# Altium footprint library d1_PcbLib.PcbLib: 266 footprints (part 11 of 17)
Each footprint in its own frame and in the unit in brackets; x right, y up, seen from the top. Pads: shape width x height; smd on the part's side, far side on the other; paste and mask are expansions set on the pad; w line width, h text height; cw(c..) or ccw(c..) is an arc to the next point about the centre after c.
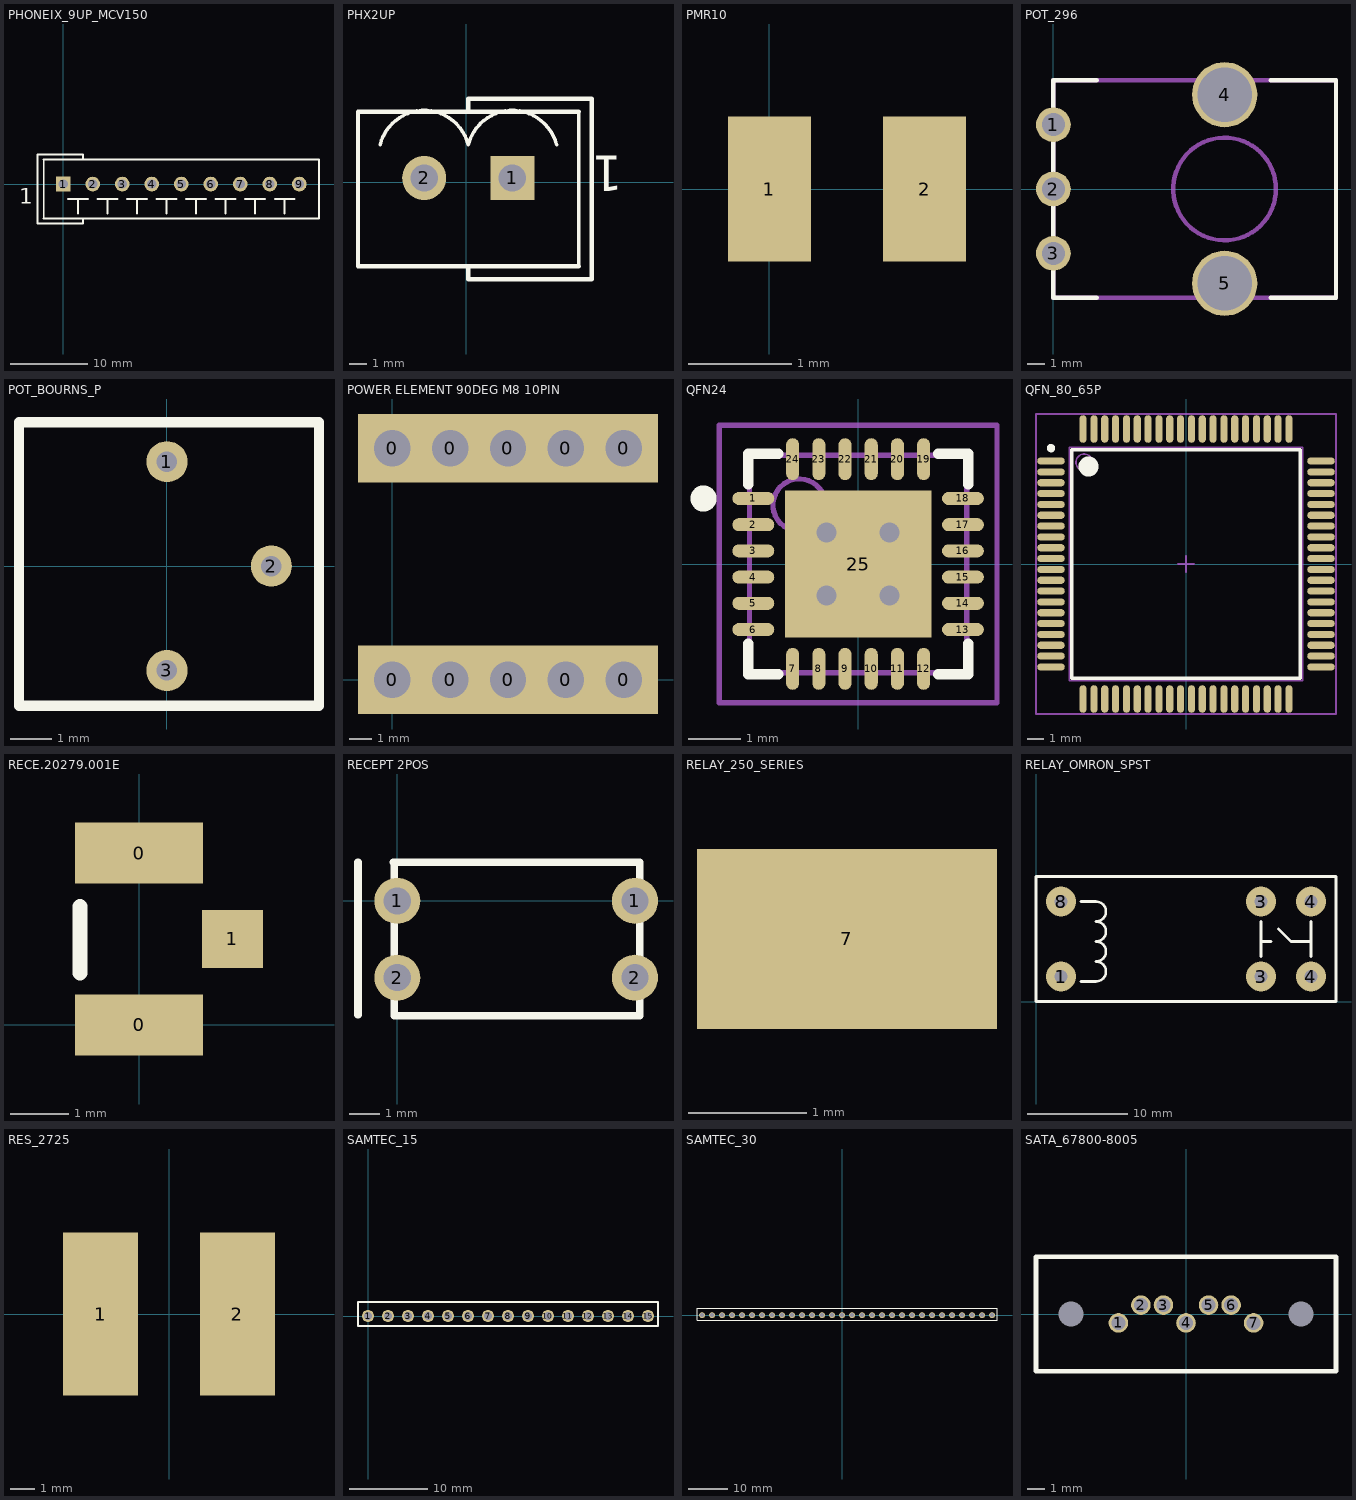
[diagram p10: the footprints below, top view; thin cyan lines are the x and y axes]

## PHONEIX_9UP_MCV150 [mil] "9 pin Phoneix conector"
height 100
pads (9):
  rect 75x75 hole 47: 1(0,0)
  round 75 hole 47: 2(150,0) 3(300,0) 4(450,0) 5(600,0) 6(750,0) 7(900,0) 8(1050,0) 9(1200,0)
Top Overlay:
  lines w8: -100,-175 -100,125 ; 1300,-175 1300,125
  lines w10: -100,-175 1300,-175 ; -100,125 1300,125 ; 25,-75 125,-75 ; 75,-150 75,-75 ; 100,-175 100,-200 -130,-200 -130,150 100,150 100,130 ; 175,-75 275,-75 ; 225,-150 225,-75 ; 325,-75 425,-75 ; 375,-150 375,-75 ; 475,-75 575,-75 ; 525,-150 525,-75 ; 625,-75 725,-75 ; 675,-150 675,-75 ; 775,-75 875,-75 ; 825,-150 825,-75 ; 925,-75 1025,-75 ; 975,-150 975,-75 ; 1075,-75 1175,-75 ; 1125,-150 1125,-75
  text "1" at -225,-100 h80

## PHX2UP [mil]
pads (2):
  rect 100x100 hole 62: 1(105,10)
  round 100 hole 62: 2(-95,10)
Top Overlay:
  lines w8: -245,-190 -245,160 ; -195.02,84.94 cw(c-95,60) 5.02,84.94 cw(c105,60) 205.02,84.94 ; 255,-190 255,160
  lines w10: -245,-190 255,-190 ; -245,160 255,160 ; 5,-190 5,-220 285,-220 285,190 275,190 5,190 5,160
  text "1" at 355,60 h80
3D body: height 472.44, standoff -153.54, extent -234.37,-178.58 244.37,160

## PMR10 [mm]
pads (2):
  rect 0.8x1.4 smd: 1(0,0) 2(1.5,0)

## POT_296 [mil]
pads (5):
  round 80 hole 53: 1(0,148) 2(0,0) 3(0,-148)
  round 150 hole 125: 4(394,217) 5(394,-217)
Top Overlay:
  lines w10: 100,-250 0,-250 0,250 100,250 ; 500,-250 650,-250 650,250 500,250
Mechanical 13:
  circle w10: c393.7,0 r118.11
  lines w10: 0,-250 650,-250 650,0 650,250 0,250 0,-250
3D body: height 342, standoff 0, extent 0.02,-249.98 649.98,249.98
3D body: height 800, standoff 0, extent 275.25,-118.46 512.16,118.46

## POT_BOURNS_P [mm]
height 4.7
pads (3):
  round 1 hole 0.5: 1(0,2.54) 2(2.54,0) 3(0,-2.54)
Top Overlay:
  lines w0.254: -3.6,-3.4 -3.6,3.5 3.7,3.5 3.7,-3.4 -3.6,-3.4
3D body: height 4.4, standoff -3, extent -3.325,-3.277 3.275,3.323

## POWER ELEMENT 90DEG M8 10PIN [mm]
pads (10):
  rect 3x3 hole 1.6: 0(0,0) 0(0,10.16) 0(2.54,0) 0(2.54,10.16) 0(5.08,10.16) 0(5.08,0) 0(7.62,0) 0(7.62,10.16) 0(10.16,10.16) 0(10.16,0)
3D body: height 20.57, standoff -3.5, extent -6.706,-5.566 13.294,62.125

## QFN24 [mm] "QFN, 24-Leads, Body 4.2x4.2mm (max), Pitch 0.50mm, IPC Medium Density"
height 0.8
pads (25):
  oval 0.8x0.25 smd: 1(-2,1.25) 2(-2,0.75) 3(-2,0.25) 4(-2,-0.25) 5(-2,-0.75) 6(-2,-1.25) 13(2,-1.25) 14(2,-0.75) 15(2,-0.25) 16(2,0.25) 17(2,0.75) 18(2,1.25)
  oval 0.25x0.8 smd: 7(-1.25,-2) 8(-0.75,-2) 9(-0.25,-2) 10(0.25,-2) 11(0.75,-2) 12(1.25,-2) 19(1.25,2) 20(0.75,2) 21(0.25,2) 22(-0.25,2) 23(-0.75,2) 24(-1.25,2)
  rect 2.8x2.8 smd: 25(0,0)
via -0.6,0.6 diameter 0.762 hole 0.381
via 0.6,0.6 diameter 0.762 hole 0.381
via -0.6,-0.6 diameter 0.762 hole 0.381
via 0.6,-0.6 diameter 0.762 hole 0.381
Top Overlay:
  circle w0.25: c-2.95,1.25 r0.125
  lines w0.2: -2.1,-1.525 -2.1,-2.1 -1.525,-2.1 ; -2.1,1.525 -2.1,2.1 -1.525,2.1 ; 1.525,-2.1 2.1,-2.1 2.1,-1.525 ; 1.525,2.1 2.1,2.1 2.1,1.525
Mechanical 13:
  circle w0.1: c-1.125,1.125 r0.5
  lines w0.1: -2.075,-2.075 -2.075,2.075 2.075,2.075 2.075,-2.075 -2.075,-2.075
Mechanical 15:
  lines w0.1: -0.5,0 0.5,0 ; 0,-0.5 0,0.5 ; -2.65,-2.65 -2.65,2.65 2.65,2.65 2.65,-2.65 -2.65,-2.65
3D body: height 0.8, standoff 0.01, extent -2.075,-2.075 2.075,2.075

## QFN_80_65P [mm]
pads (80):
  oval 1.651x0.432 smd: 1(-8.1,6.175) 2(-8.1,5.525) 3(-8.1,4.875) 4(-8.1,4.225) 5(-8.1,3.575) 6(-8.1,2.925) 7(-8.1,2.275) 8(-8.1,1.625) 9(-8.1,0.975) 10(-8.1,0.325) 11(-8.1,-0.325) 12(-8.1,-0.975) 13(-8.1,-1.625) 14(-8.1,-2.275) 15(-8.1,-2.925) 16(-8.1,-3.575) 17(-8.1,-4.225) 18(-8.1,-4.875) 19(-8.1,-5.525) 20(-8.1,-6.175) 41(8.1,-6.175) 42(8.1,-5.525) 43(8.1,-4.875) 44(8.1,-4.225) 45(8.1,-3.575) 46(8.1,-2.925) 47(8.1,-2.275) 48(8.1,-1.625) 49(8.1,-0.975) 50(8.1,-0.325) 51(8.1,0.325) 52(8.1,0.975) 53(8.1,1.625) 54(8.1,2.275) 55(8.1,2.925) 56(8.1,3.575) 57(8.1,4.225) 58(8.1,4.875) 59(8.1,5.525) 60(8.1,6.175)
  oval 0.432x1.651 smd: 21(-6.175,-8.1) 22(-5.525,-8.1) 23(-4.875,-8.1) 24(-4.225,-8.1) 25(-3.575,-8.1) 26(-2.925,-8.1) 27(-2.275,-8.1) 28(-1.625,-8.1) 29(-0.975,-8.1) 30(-0.325,-8.1) 31(0.325,-8.1) 32(0.975,-8.1) 33(1.625,-8.1) 34(2.275,-8.1) 35(2.925,-8.1) 36(3.575,-8.1) 37(4.225,-8.1) 38(4.875,-8.1) 39(5.525,-8.1) 40(6.175,-8.1) 61(6.175,8.1) 62(5.525,8.1) 63(4.875,8.1) 64(4.225,8.1) 65(3.575,8.1) 66(2.925,8.1) 67(2.275,8.1) 68(1.625,8.1) 69(0.975,8.1) 70(0.325,8.1) 71(-0.325,8.1) 72(-0.975,8.1) 73(-1.625,8.1) 74(-2.275,8.1) 75(-2.925,8.1) 76(-3.575,8.1) 77(-4.225,8.1) 78(-4.875,8.1) 79(-5.525,8.1) 80(-6.175,8.1)
Top Overlay:
  circle w0.6: c-5.85,5.85 r0.3
  circle w0.25: c-8.1,6.95 r0.125
  lines w0.2: -6.85,-6.85 6.85,-6.85 6.85,6.85 -6.85,6.85 -6.85,-6.85
Mechanical 13:
  circle w0.1: c-6.1,6.1 r0.5
  lines w0.1: -7,-7 7,-7 7,7 -7,7 -7,-7
Mechanical 15:
  lines w0.1: -0.5,0 0.5,0 ; 0,-0.5 0,0.5 ; -9,-9 9,-9 9,9 -9,9 -9,-9
3D body: height 2.45, standoff 0, extent -7,-7 7,7

## RECE.20279.001E [mm] "U.FL Connector Footprint"
height 1.25
pads (3):
  rect 2.2x1.05 smd: 0(0,0) 0(0,2.95)
  rect 1.05x1 smd: 1(1.6,1.475)
Top Overlay:
  lines w0.254: -1.016,0.889 -1.016,2.032

## RECEPT 2POS [mil]
pads (4):
  round 60 hole 35.43: 1(0,0) 1(309.84,0) 2(0,-100) 2(309.84,-100)
Top Overlay:
  lines w10: -51.18,-148.62 -51.18,50.2 ; -4.92,50.2 315.94,50.2 315.94,-149.61 -3.94,-149.61 -3.94,50.2
3D body: height 132.14, standoff -120.51, extent -3.5,-149.8 316.5,50.2

## RELAY_250_SERIES [mil] "FOR HG2-DC12V"
pads (1):
  rect 100x60 smd: 7(-136,212)
via 2,4 diameter 50 hole 28
via 174,4 diameter 50 hole 28
via 175,83 diameter 50 hole 28
via 3,87 diameter 50 hole 28
via 2,190 diameter 50 hole 28
via 176,193 diameter 50 hole 28
via 171,369 diameter 50 hole 28
via -11,371 diameter 50 hole 28

## RELAY_OMRON_SPST [mm]
height 15.7
pads (6):
  round 3 hole 1.3: 1(2.5,2.5) 3(22.5,2.5) 3(22.5,10) 4(27.5,2.5) 4(27.5,10) 8(2.5,10)
Top Overlay:
  lines w0.254: 4.5,2 6,2 ccw(c6,3) 6,4 ccw(c6,5) 6,6 ccw(c6,7) 6,8 ccw(c6,9) 6,10 4.5,10 ; 22.5,4.5 22.5,8 ; 22.5,6 23.5,6 ; 24.25,7.25 25.5,6 27.5,6 ; 27.5,4.5 27.5,8 ; 0,0 0,12.5 30,12.5 30,0 0,0

## RES_2725 [mil]
pads (2):
  rect 120x260 smd: 1(-109,0) 2(109,0)

## SAMTEC_15 [mil]
pads (15):
  round 60 hole 40: 1(0,0) 2(100,0) 3(200,0) 4(300,0) 5(400,0) 6(500,0) 7(600,0) 8(700,0) 9(800,0) 10(900,0) 11(1000,0) 12(1100,0) 13(1200,0) 14(1300,0) 15(1400,0)
Top Overlay:
  lines w10: -50,-50 -50,70 1450,70 1450,-50 -50,-50

## SAMTEC_30 [mil]
pads (30):
  round 60 hole 40: 1(-1400,0) 2(-1300,0) 3(-1200,0) 4(-1100,0) 5(-1000,0) 6(-900,0) 7(-800,0) 8(-700,0) 9(-600,0) 10(-500,0) 11(-400,0) 12(-300,0) 13(-200,0) 14(-100,0) 15(0,0) 16(100,0) 17(200,0) 18(300,0) 19(400,0) 20(500,0) 21(600,0) 22(700,0) 23(800,0) 24(900,0) 25(1000,0) 26(1100,0) 27(1200,0) 28(1300,0) 29(1400,0) 30(1500,0)
Top Overlay:
  lines w10: -1450.59,-48.03 1549.41,-48.03 1549.41,71.97 -1450.59,71.97 -1450.59,-48.03

## SATA_67800-8005 [mm]
pads (9):
  round 0 hole 1.4: 0(-6.48,0) 0(6.48,0)
  round 1.1 hole 0.8: 1(-3.81,-0.5) 2(-2.54,0.5) 3(-1.27,0.5) 4(0,-0.5) 5(1.27,0.5) 6(2.54,0.5) 7(3.81,-0.5)
Top Overlay:
  lines w0.254: -8.45,-3.225 8.45,-3.225 8.45,3.225 -8.45,3.225 -8.45,-3.225